# Altium footprint library sun_library.PcbLib: 412 footprints (part 7 of 26)
Each footprint in its own frame and in the unit in brackets; x right, y up, seen from the top. Pads: shape width x height; smd on the part's side, far side on the other; paste and mask are expansions set on the pad; w line width, h text height; cw(c..) or ccw(c..) is an arc to the next point about the centre after c.
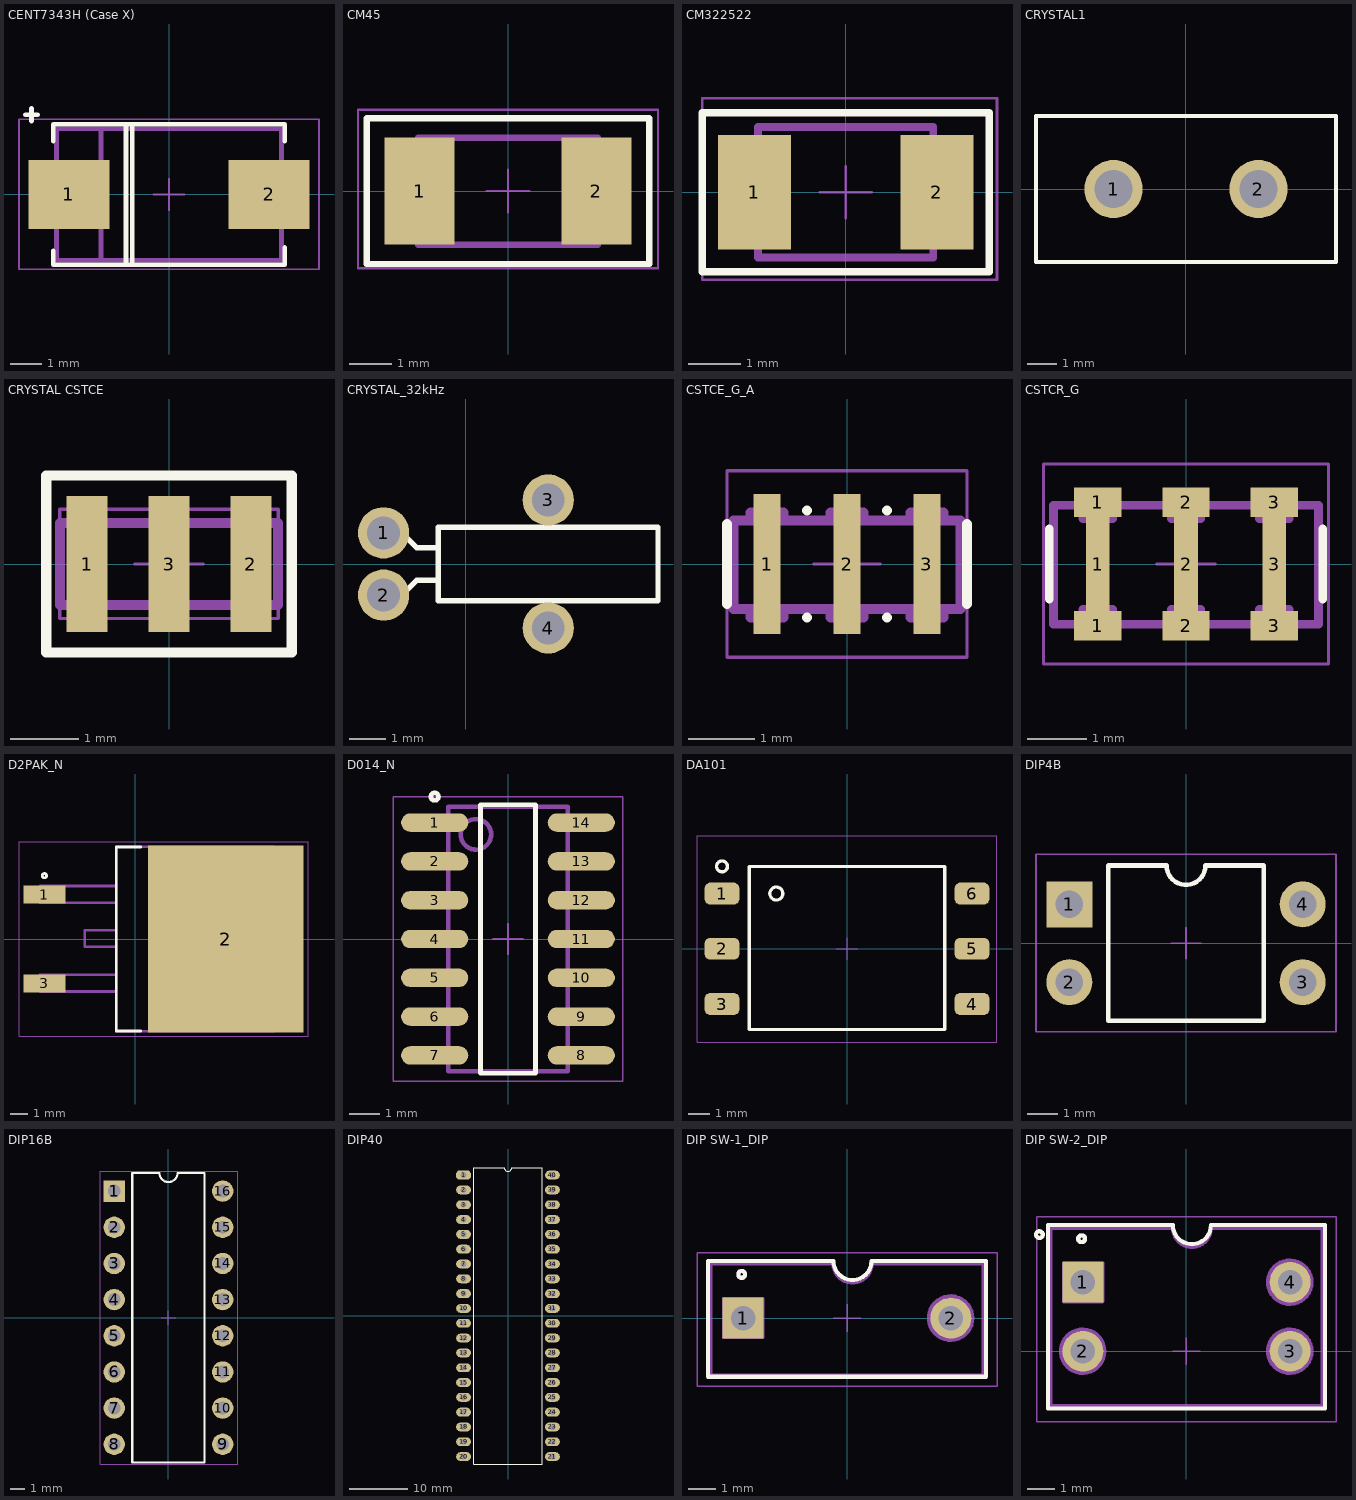
[diagram p6: the footprints below, top view; thin cyan lines are the x and y axes]

## CENT7343H (Case X) [mm] "Capacitor, SM Tantalum; Body 7.3 x 4.3 mm (LxW typ)"
height 4.3
pads (2):
  rect 2.6x2.2 smd: 1(-3.2,0) 2(3.2,0)
Top Overlay:
  lines w0.15: -4.6,2.55 -4.2,2.55 ; -4.4,2.35 -4.4,2.75 ; -3.7,-1.8 -3.7,-2.25 3.7,-2.25 3.7,-1.7 ; -3.7,1.7 -3.7,2.25 3.7,2.25 3.7,1.7 ; -1.375,-2.25 -1.375,2.25 ; -1.175,-2.25 -1.175,2.25
TopAssy 13:
  lines w0.15: -3.6,-0.775 -3.825,-0.775 -3.825,0.8 -3.6,0.8 ; -2.175,-2.1 -2.175,2.1 ; 3.6,-0.75 3.825,-0.75 3.825,0.825 3.6,0.825 ; -3.6,-2.1 3.6,-2.1 3.6,2.1 -3.6,2.1 -3.6,-2.1
  text "+" at -1.975,0.625 h0.96
CourtTop 15:
  lines w0.05: -0.5,0 0.5,0 ; 0,-0.5 0,0.5 ; -4.8,-2.4 4.8,-2.4 4.8,2.4 -4.8,2.4 -4.8,-2.4
3D body "User Library-CaseX_7343-43.step": height 4, standoff 0, extent -3.65,-2.15 3.65,2.15

## CM45 [mm]
pads (2):
  rect 1.63x2.5 smd: 1(-2.065,0) 2(2.065,0)
Top Overlay:
  lines w0.15: -3.3,-1.7 -3.3,1.7 3.3,1.7 3.3,-1.7 -3.3,-1.7
TopAssy 13:
  lines w0.15: -2.3,-0.825 -2.3,0.85 -2.1,0.85 -2.1,-0.825 -2.3,-0.825 ; -2.1,-1.25 -2.1,1.25 2.1,1.25 2.1,-1.25 -2.1,-1.25 ; 2.1,-0.8 2.3,-0.8 2.3,0.875 2.1,0.875 2.1,-0.8
CourtTop 15:
  lines w0.05: -0.5,0 0.5,0 ; 0,-0.5 0,0.5 ; -3.5,-1.8 3.5,-1.8 3.5,1.9 -3.5,1.9 -3.5,-1.8
3D body "68520.stp": height 3.25, standoff 0.05, extent -2.25,-1.6 2.25,1.6
3D body: height 2.1, standoff 0, extent -2.299,-0.824 -2.101,0.849
3D body: height 2.1, standoff 0, extent 2.101,-0.799 2.299,0.874

## CM322522 [mm]
height 11.4
pads (2):
  rect 1.4x2.2 smd: 1(-1.75,0) 2(1.75,0)
Top Overlay:
  lines w0.15: -2.75,-1.525 2.75,-1.525 2.75,1.525 -2.75,1.525 -2.75,-1.525
TopAssy 13:
  lines w0.15: -1.679,-0.825 -2.1,-0.825 ; -1.679,0.85 -2.1,0.85 -2.1,-0.825 ; 1.679,-0.8 2.1,-0.8 2.1,0.875 1.679,0.875 ; -2.1,-0.825 -2.1,-0.825 ; -1.679,-1.25 1.679,-1.25 1.679,1.25 -1.679,1.25 -1.679,-1.25
CourtTop 15:
  lines w0.05: -0.5,0 0.5,0 ; 0,-0.5 0,0.5 ; -2.75,-1.675 -2.75,1.8 2.9,1.8 2.9,-1.675 -2.75,-1.675
3D body "User Library-CM322522_L_SMD.step": height 3.2, standoff 0, extent -2.25,-1.5 2.25,1.7

## CRYSTAL1 [mm]
pads (2):
  round 2.01 hole 1.3: 1(-2.5,0) 2(2.5,0)
Top Overlay:
  lines w0.15: 5.175,2.52 5.175,-2.52 -5.175,-2.52 -5.175,2.522 5.175,2.522

## CRYSTAL CSTCE [mm] "Crystal CSTCE, Body 3.2x1.3mm"
height 0.9
pads (3):
  rect 0.6x2 smd: 1(-1.2,0) 2(1.2,0) 3(0,0)
Top Overlay:
  lines w0.15: -1.8,-1.3 1.8,-1.3 1.8,1.3 -1.8,1.3 -1.8,-1.3
TopAssy 13:
  lines w0.15: -1.6,-0.6 -1.6,0.6 1.6,0.6 1.6,-0.6 -1.6,-0.6
CourtTop 15:
  lines w0.05: -0.5,0 0.5,0 ; 0,-0.5 0,0.5 ; -1.6,-0.8 -1.6,0.8 1.6,0.8 1.6,-0.8 -1.6,-0.8
3D body "User Library-CSTCE.step": height 0.7, standoff 0, extent -1.6,-0.65 1.6,0.65

## CRYSTAL_32kHz [mm]
pads (4):
  round 1.4 hole 0.9: 1(-2.25,0.85) 2(-2.25,-0.85) 3(2.25,1.75) 4(2.25,-1.75)
Top Overlay:
  lines w0.15: -2.25,0.85 -1.75,0.85 -1.35,0.45 -0.75,0.45 ; -1.2,-0.45 -0.75,-0.45 -1.35,-0.45 -1.75,-0.85 ; -1.75,-0.85 -2.25,-0.85 -1.75,-0.85 ; -0.75,-1 -0.75,1 5.25,1 5.25,-1 -0.75,-1

## CSTCE_G_A [mm] "Ceramic Resonators with built-in load capacitors CSTCE8M00G55A-R0"
height 0.7
pads (3):
  rect 0.4x2.1 smd: 1(-1.2,0) 2(0,0) 3(1.2,0)
Top Overlay:
  lines w0.15: -1.8,-0.6 -1.8,0.6 ; 1.8,-0.6 1.8,0.6 ; -0.6,-0.8 -0.6,-0.8 ; -0.6,0.8 -0.6,0.8 ; 0.6,-0.8 0.6,-0.8 ; 0.6,0.8 0.6,0.8
TopAssy 13:
  lines w0.15: -1.45,-0.675 -1.45,-0.8 -0.95,-0.8 -0.95,-0.675 ; -1.45,0.65 -1.45,0.775 -0.95,0.775 -0.95,0.65 ; -0.25,-0.675 -0.25,-0.8 0.25,-0.8 0.25,-0.675 ; -0.25,0.65 -0.25,0.775 0.25,0.775 0.25,0.65 ; 0.95,-0.675 0.95,-0.8 1.45,-0.8 1.45,-0.675 ; 0.95,0.65 0.95,0.775 1.45,0.775 1.45,0.65 ; -1.7,-0.675 -1.7,0.65 1.7,0.65 1.7,-0.675 -1.7,-0.675
CourtTop 15:
  lines w0.05: -0.5,0 0.5,0 ; 0,-0.5 0,0.5 ; -1.8,-1.4 -1.8,1.4 1.8,1.4 1.8,-1.4 -1.8,-1.4
3D body "User Library-CSTCE.step": height 0.7, standoff 0, extent -1.6,-0.65 1.6,0.65

## CSTCR_G [mm] "Ceramic Resonators with built-in load capacitors CSTCR4M00G53-R0"
height 0.7
pads (9):
  rect 0.8x0.5 smd: 1(-1.5,-1.05) 1(-1.5,1.05) 2(0,-1.05) 2(0,1.05) 3(1.5,-1.05) 3(1.5,1.05)
  rect 0.4x2.1 smd: 1(-1.5,0) 2(0,0) 3(1.5,0)
Top Overlay:
  lines w0.15: -2.325,-0.6 -2.325,0.6 ; 2.325,-0.6 2.325,0.6
TopAssy 13:
  lines w0.15: -1.75,-1 -1.75,-0.775 -1.25,-0.775 -1.25,-1 ; -1.75,1 -1.75,0.775 -1.25,0.775 -1.25,1 ; -0.25,-1 -0.25,-0.775 0.25,-0.775 0.25,-1 ; -0.25,1 -0.25,0.775 0.25,0.775 0.25,1 ; 1.25,-1 1.25,-0.775 1.75,-0.775 1.75,-1 ; 1.25,1 1.25,0.775 1.75,0.775 1.75,1 ; -2.25,-1.025 2.25,-1.025 2.25,1 -2.25,1 -2.25,-1.025
CourtTop 15:
  lines w0.05: -0.5,0 0.5,0 ; 0,-0.5 0,0.5 ; -2.425,-1.7 2.425,-1.7 2.425,1.7 -2.425,1.7 -2.425,-1.7
3D body "User Library-CSTCR4M00G53.step": height 1.15, standoff 0, extent -2.25,-1 2.25,1

## D2PAK_N [mm] "D2-PAK, 4-Leads, Body 8.8x10.4mm, Pitch 2.54mm, Lead Span 15.1mm, IPC Medium Density"
height 4.69
pads (3):
  rect 2.4x1.05 smd: 1(-5.175,2.54) 3(-5.175,-2.54)
  rect 8.9x10.65 smd paste-5: 2(5.175,0)
Top Overlay:
  circle w0.15: c-5.175,3.615 r0.125
  lines w0.15: 0.325,-5.25 -1.075,-5.25 -1.075,5.25 0.325,5.25
Top Paste:
  rectangle: 6.075,0.825 9.55,5.25
  rectangle: 0.825,0.775 4.3,5.25
  rectangle: 0.825,-5.2 4.3,-0.775
  rectangle: 6.075,-5.2 9.55,-0.875
TopAssy 13:
  lines w0.15: -1.075,-3 -5.425,-3 -5.425,-2.05 -1.075,-2.05 ; -1.075,-0.45 -2.875,-0.45 -2.875,0.5 -1.075,0.5 ; -1.075,2.1 -1.1,2.075 -5.425,2.075 -5.425,3.025 -1.075,3.025 ; 7.925,-5.275 -1.075,-5.275 -1.075,5.275 7.925,5.275 ; 7.925,-5.275 7.925,5.275 ; 7.925,-5.275 8.975,-4.225 8.975,4.2 7.925,5.25 7.925,5.275
CourtTop 15:
  lines w0.05: 1.125,0 2.125,0 ; 1.625,-0.5 1.625,0.5 ; -6.625,-5.55 9.875,-5.55 9.875,5.55 -6.625,5.55 -6.625,-5.55
3D body "User Library-D2PAK.step": height 4.98, standoff -0.03, extent -6.041,-5.08 9.223,5.08

## D014_N [mm] "14-Pin Small Outline Integrated Circuit 1.27 mm Pitch, IPC Medium Density"
height 1.75
pads (14):
  oval 2.2x0.6 smd: 1(-2.4,3.81) 2(-2.4,2.54) 3(-2.4,1.27) 4(-2.4,0) 5(-2.4,-1.27) 6(-2.4,-2.54) 7(-2.4,-3.81) 8(2.4,-3.81) 9(2.4,-2.54) 10(2.4,-1.27) 11(2.4,0) 12(2.4,1.27) 13(2.4,2.54) 14(2.4,3.81)
Top Overlay:
  circle w0.15: c-2.4,4.66 r0.125
  lines w0.15: -0.9,-4.4 -0.9,4.4 0.9,4.4 0.9,-4.4 -0.9,-4.4
TopAssy 13:
  circle w0.15: c-1.05,3.425 r0.5
  lines w0.15: -1.95,-4.325 -1.95,4.325 1.95,4.325 1.95,-4.325 -1.95,-4.325
CourtTop 15:
  lines w0.05: -0.5,0 0.5,0 ; 0,-0.5 0,0.5 ; -3.75,-4.65 -3.75,4.65 3.75,4.65 3.75,-4.65 -3.75,-4.65
3D body: height 1.75, standoff 0, extent -1.95,-4.325 1.95,4.325

## DA101 [mm]
height 6.5
pads (6):
  rrect50% 1.6x1 smd: 1(-5.75,2.54) 2(-5.75,0) 3(-5.75,-2.54) 4(5.75,-2.54) 5(5.75,0) 6(5.75,2.54)
Top Overlay:
  circle w0.15: c-5.75,3.79 r0.25
  circle w0.15: c-3.25,2.54 r0.3
  lines w0.15: -4.5,-3.71 -4.5,3.79 4.5,3.79 4.5,-3.71 -4.5,-3.71
CourtTop 15:
  lines w0.05: -0.5,0 0.5,0 ; 0,-0.5 0,0.5 ; -6.9,-4.3 -6.9,5.2 6.9,5.2 6.9,-4.3 -6.9,-4.3
3D body "User Library-DA101C.step": height 6.35, standoff -3, extent -5.13,-4.06 5.23,4.94

## DIP4B [mm]
pads (4):
  rect 1.5x1.5 hole 0.9: 1(-3.81,1.27)
  round 1.5 hole 0.9: 2(-3.81,-1.27) 3(3.81,-1.27) 4(3.81,1.27)
Top Overlay:
  lines w0.15: -2.54,-2.53 2.54,-2.53 2.54,2.54 0.635,2.54 cw(c0,2.54) -0.635,2.54 -2.54,2.54 -2.54,-2.53
CourtTop 15:
  lines w0.05: -0.5,0 0.5,0 ; 0,-0.5 0,0.5 ; -4.9,-2.9 -4.9,2.9 4.9,2.9 4.9,-2.9 -4.9,-2.9
3D body "User Library-PC814.step": height 4.46, standoff -1.5, extent -3.95,-2.33 3.93,2.27

## DIP16B [mm]
pads (16):
  rect 1.5x1.5 hole 0.9: 1(-3.81,8.89)
  round 1.5 hole 0.9: 2(-3.81,6.35) 3(-3.81,3.81) 4(-3.81,1.27) 5(-3.81,-1.27) 6(-3.81,-3.81) 7(-3.81,-6.35) 8(-3.81,-8.89) 9(3.81,-8.89) 10(3.81,-6.35) 11(3.81,-3.81) 12(3.81,-1.27) 13(3.81,1.27) 14(3.81,3.81) 15(3.81,6.35) 16(3.81,8.89)
Top Overlay:
  lines w0.15: -2.54,-10.16 2.54,-10.16 2.54,10.16 0.635,10.16 cw(c0,10.16) -0.635,10.16 -2.54,10.16 -2.54,-10.16
CourtTop 15:
  lines w0.05: -0.5,0 0.5,0 ; 0,-0.5 0,0.5 ; -4.8,-10.275 4.875,-10.275 4.875,10.275 -4.8,10.275 -4.8,-10.275

## DIP40 [mil]
pads (40):
  oct 100x60 hole 40: 1(-300,950)
  oval 100x60 hole 40: 2(-300,850) 3(-300,750) 4(-300,650) 5(-300,550) 6(-300,450) 7(-300,350) 8(-300,250) 9(-300,150) 10(-300,50) 11(-300,-50) 12(-300,-150) 13(-300,-250) 14(-300,-350) 15(-300,-450) 16(-300,-550) 17(-300,-650) 18(-300,-750) 19(-300,-850) 20(-300,-950) 21(300,-950) 22(300,-850) 23(300,-750) 24(300,-650) 25(300,-550) 26(300,-450) 27(300,-350) 28(300,-250) 29(300,-150) 30(300,-50) 31(300,50) 32(300,150) 33(300,250) 34(300,350) 35(300,450) 36(300,550) 37(300,650) 38(300,750) 39(300,850) 40(300,950)
Top Overlay:
  lines w5.91: -232.57,-1000 232,-1000 232,1000 25,1000 cw(c0,1000) -25,1000 -232.57,1000 -232.57,-1000
3D body "User Library-DIP40-600.step": height 224.41, standoff -101.57, extent -300.98,-1032.48 308.86,1032.48

## DIP SW-1_DIP [mm] "DS1040-01; 2 Leads; Row Spacing 7.62 mm; Pitch 2.54 mm"
height 5
pads (2):
  rect 1.5x1.5 hole 0.9: 1(-3.81,0)
  round 1.5 hole 0.9: 2(3.81,0)
Top Overlay:
  circle w0.15: c-3.86,1.6 r0.125
  lines w0.15: -5.1,-2.15 -5.1,2.1 -0.5,2.1 ccw(c0.2,2.1) 0.9,2.1 5.09,2.1 5.09,-2.15 -5.1,-2.15
TopAssy 13:
  circle w0.15: c-3.86,1.6 r0.125
  circle w0.15: c3.8,0 r0.8
  lines w0.15: -5,2 -0.5,2 ccw(c0.2,2) 0.9,2 5,2 ; -5,2.1 -5,-2.1 5,-2.1 5,2.1 ; -4.5,-0.7 -4.5,0.7 -3.1,0.7 -3.1,-0.7 -4.5,-0.7
CourtTop 15:
  lines w0.05: -0.5,0 0.5,0 ; 0,-0.5 0,0.5 ; -5.5,-2.5 5.5,-2.5 5.5,2.4 -5.5,2.4 -5.5,-2.5
3D body "User Library-DS1040-01 (DIP_switch).step": height 6.81, standoff -3.84, extent -4.95,-2 4.95,2

## DIP SW-2_DIP [mm] "DS1040-02; 4 Leads; Row Spacing 7.62 mm; Pitch 2.54 mm"
height 5
pads (4):
  rect 1.5x1.5 hole 0.9: 1(-3.81,2.54)
  round 1.5 hole 0.9: 2(-3.81,0) 3(3.81,0) 4(3.81,2.54)
Top Overlay:
  circle w0.15: c-3.86,4.14 r0.125
  circle w0.15: c-5.411,4.29 r0.125
  lines w0.15: -5.1,-2.113 5.09,-2.113 5.09,4.64 0.9,4.64 cw(c0.2,4.64) -0.5,4.64 -5.1,4.64 -5.1,-2.113
TopAssy 13:
  circle w0.15: c3.8,2.54 r0.8
  circle w0.15: c-3.86,4.14 r0.125
  circle w0.15: c-3.82,0 r0.8
  circle w0.15: c3.8,0 r0.8
  lines w0.15: -5,-2.013 -5,4.54 -0.5,4.54 ccw(c0.2,4.54) 0.9,4.54 5,4.54 5,-2.013 -5,-2.013 ; -4.5,1.84 -3.1,1.84 -3.1,3.24 -4.5,3.24 -4.5,1.84
CourtTop 15:
  lines w0.05: -0.5,0 0.5,0 ; 0,-0.5 0,0.5 ; -5.5,-2.6 -5.5,4.94 5.5,4.94 5.5,-2.6 -5.5,-2.6
3D body "User Library-DS1040-02 (DIP_switch).step": height 6.81, standoff -3.84, extent -4.95,-2 4.95,4.54